# Altium footprint library mastermind.PCBLIB: 1061 footprints (part 31 of 67)
Each footprint in its own frame and in the unit in brackets; x right, y up, seen from the top. Pads: shape width x height; smd on the part's side, far side on the other; paste and mask are expansions set on the pad; w line width, h text height; cw(c..) or ccw(c..) is an arc to the next point about the centre after c.
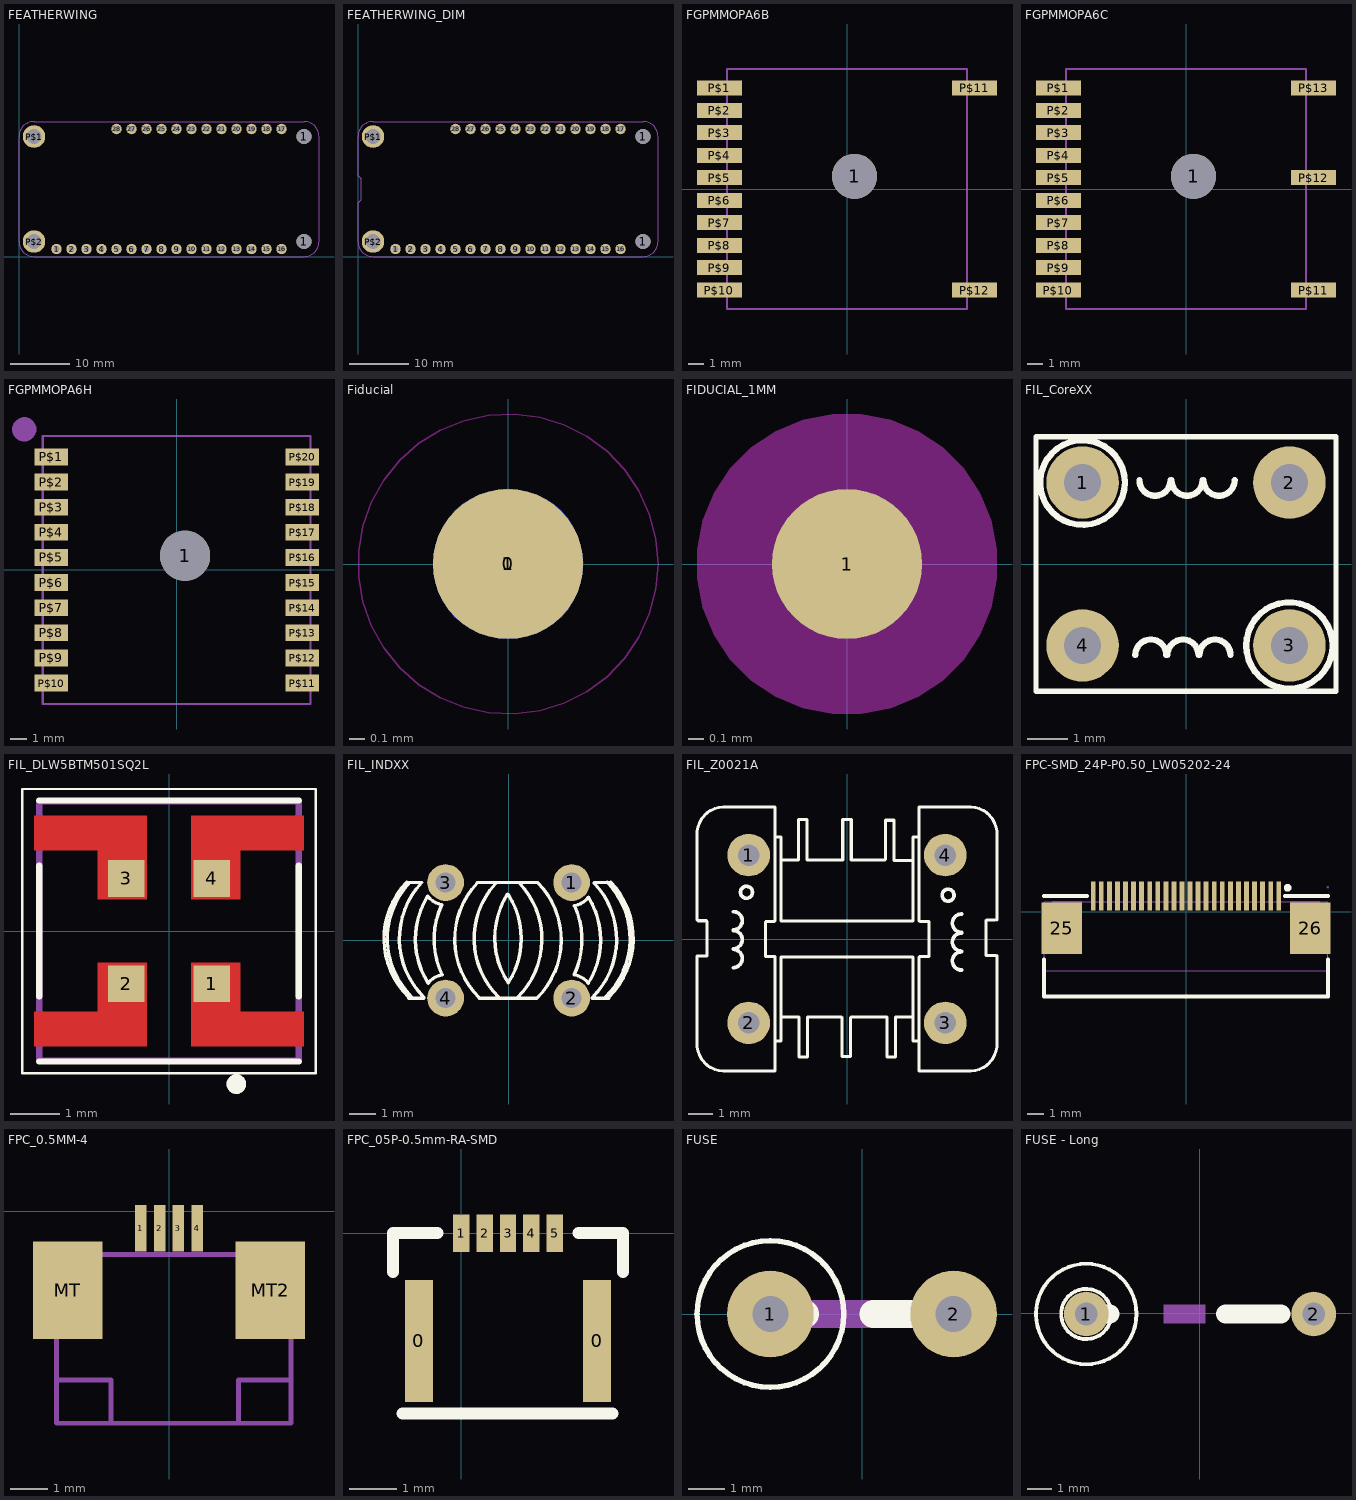
[diagram p30: the footprints below, top view; thin cyan lines are the x and y axes]

## FEATHERWING [mil]
pads (32):
  round 70 hole 39.37: 1(250,50) 2(350,50) 3(450,50) 4(550,50) 5(650,50) 6(750,50) 7(850,50) 8(950,50) 9(1050,50) 10(1150,50) 11(1250,50) 12(1350,50) 13(1450,50) 14(1550,50) 15(1650,50) 16(1750,50) 17(1750,850) 18(1650,850) 19(1550,850) 20(1450,850) 21(1350,850) 22(1250,850) 23(1150,850) 24(1050,850) 25(950,850) 26(850,850) 27(750,850) 28(650,850)
  round 100 hole 100: 1(1900,100) 1(1900,800)
  round 150 hole 98.43: P$1(100,800) P$2(100,100)
Mechanical 1:
  lines w0: 0,100 ccw(c100,100) 100,0 1900,0 ccw(c1900,100) 2000,100 2000,800 ccw(c1900,800) 1900,900 100,900 ccw(c100,800) 0,800 0,100

## FEATHERWING_DIM [mil]
pads (32):
  round 70 hole 39.37: 1(250,50) 2(350,50) 3(450,50) 4(550,50) 5(650,50) 6(750,50) 7(850,50) 8(950,50) 9(1050,50) 10(1150,50) 11(1250,50) 12(1350,50) 13(1450,50) 14(1550,50) 15(1650,50) 16(1750,50) 17(1750,850) 18(1650,850) 19(1550,850) 20(1450,850) 21(1350,850) 22(1250,850) 23(1150,850) 24(1050,850) 25(950,850) 26(850,850) 27(750,850) 28(650,850)
  round 100 hole 100: 1(1900,100) 1(1900,800)
  round 150 hole 98.43: P$1(100,800) P$2(100,100)
Mechanical 2:
  lines w0: 0,100 ccw(c100,100) 100,0 1900,0 ccw(c1900,100) 2000,100 2000,800 ccw(c1900,800) 1900,900 100,900 ccw(c100,800) 0,800 0,540 20,520 20,380 0,360 0,100

## FGPMMOPA6B [mm]
pads (13):
  round 3 hole 3: 1(0.5,0.85)
  rect 3x1 smd: P$1(-8.5,6.75) P$2(-8.5,5.25) P$3(-8.5,3.75) P$4(-8.5,2.25) P$5(-8.5,0.75) P$6(-8.5,-0.75) P$7(-8.5,-2.25) P$8(-8.5,-3.75) P$9(-8.5,-5.25) P$10(-8.5,-6.75) P$11(8.5,6.75) P$12(8.5,-6.75)
Mechanical 2:
  lines w0.127: -8,-8 8,-8 8,-7.5 ; -8,8 8,8 8,7.5 ; 8,-6 8,6
Mechanical 8:
  circle w0.813: c0.5,0.85 r0.5
  lines w0.127: -8,-8 8,-8 8,8 -8,8 -8,-8

## FGPMMOPA6C [mm]
pads (14):
  round 3 hole 3: 1(0.5,0.85)
  rect 3x1 smd: P$1(-8.5,6.75) P$2(-8.5,5.25) P$3(-8.5,3.75) P$4(-8.5,2.25) P$5(-8.5,0.75) P$6(-8.5,-0.75) P$7(-8.5,-2.25) P$8(-8.5,-3.75) P$9(-8.5,-5.25) P$10(-8.5,-6.75) P$11(8.5,-6.75) P$12(8.5,0.75) P$13(8.5,6.75)
Mechanical 2:
  lines w0.127: -8,-8 8,-8 8,-7.5 ; -8,8 8,8 8,7.5 ; 8,-6 8,6
Mechanical 8:
  circle w0.813: c0.5,0.85 r0.5
  lines w0.127: -8,-8 -8,8 8,8 8,-8 -8,-8

## FGPMMOPA6H [mm]
pads (21):
  round 3 hole 3: 1(0.5,0.85)
  rect 2x1 smd: P$1(-7.5,6.75) P$2(-7.5,5.25) P$3(-7.5,3.75) P$4(-7.5,2.25) P$5(-7.5,0.75) P$6(-7.5,-0.75) P$7(-7.5,-2.25) P$8(-7.5,-3.75) P$9(-7.5,-5.25) P$10(-7.5,-6.75) P$11(7.5,-6.75) P$12(7.5,-5.25) P$13(7.5,-3.75) P$14(7.5,-2.25) P$15(7.5,-0.75) P$16(7.5,0.75) P$17(7.5,2.25) P$18(7.5,3.75) P$19(7.5,5.25) P$20(7.5,6.75)
Mechanical 2:
  circle w0.813: c-9.1,8.4 r0.316
  lines w0.127: -8,-8 8,-8 8,-7.5 ; -8,8 8,8 8,7.5 ; 8,-6 8,6
Mechanical 8:
  circle w0.813: c0.5,0.85 r0.5
  lines w0.127: -8,-8 8,-8 8,8 -8,8 -8,-8

## Fiducial [mm]
pads (2):
  round 1 smd far side paste-10 mask+0.5: 0(0,0)
  round 1 smd paste-10 mask+0.5: 1(0,0)
Keep-Out Layer:
  circle w0.01: c0,0 r1

## FIDUCIAL_1MM [mm]
pads (1):
  rrect100% 1x1 smd paste-0.5 mask-0.5: 1(0,0)
Top Layer keep-out:
  region: -1,0 -1,-0.098 -0.962,-0.292 -0.886,-0.474 -0.777,-0.637 -0.637,-0.777 -0.474,-0.886 -0.292,-0.962 -0.098,-1 0,-1 0.098,-1 0.292,-0.962 0.474,-0.886 0.637,-0.777 0.777,-0.637 0.886,-0.474 0.962,-0.292 1,-0.098 1,0 1,0.098 0.962,0.292 0.886,0.474 0.777,0.637 0.637,0.777 0.474,0.886 0.292,0.962 0.098,1 0,1 -0.098,1 -0.292,0.962 -0.474,0.886 -0.637,0.777 -0.777,0.637 -0.886,0.474 -0.962,0.292 -1,0.098
Top Solder:
  region: -1,0 -1,-0.098 -0.962,-0.292 -0.886,-0.474 -0.777,-0.637 -0.637,-0.777 -0.474,-0.886 -0.292,-0.962 -0.098,-1 0,-1 0.098,-1 0.292,-0.962 0.474,-0.886 0.637,-0.777 0.777,-0.637 0.886,-0.474 0.962,-0.292 1,-0.098 1,0 1,0.098 0.962,0.292 0.886,0.474 0.777,0.637 0.637,0.777 0.474,0.886 0.292,0.962 0.098,1 0,1 -0.098,1 -0.292,0.962 -0.474,0.886 -0.637,0.777 -0.777,0.637 -0.886,0.474 -0.962,0.292 -1,0.098

## FIL_CoreXX [mil]
pads (4):
  round 70 hole 35.43: 1(-100,78.74) 2(100,78.74) 3(100,-78.74) 4(-100,-78.74)
Top Overlay:
  circle w6.06: c-100,78.74 r40.94
  circle w6.06: c100,-78.74 r41.72
  lines w5: -145,-123 145,-123 145,123 -145,123 -145,-123
  lines w6.06: -49,-88 cw(c-34,-88) -19,-88 ; -45,81 ccw(c-30,81) -15,81 ; -18,-88 cw(c-3,-88) 12,-88 ; -14,81 ccw(c1,81) 16,81 ; 13,-88 cw(c28,-88) 43,-88 ; 17,81 ccw(c32,81) 47,81

## FIL_DLW5BTM501SQ2L [mm]
pads (4):
  rect 0.75x0.75 smd: 1(0.875,-1.075) 2(-0.875,-1.075) 3(-0.875,1.075) 4(0.875,1.075)
Top Layer:
  region: -0.45,2.35 -2.75,2.35 -2.75,1.65 -1.45,1.65 -1.45,0.65 -0.45,0.65
  region: 1.45,1.65 2.75,1.65 2.75,2.35 0.45,2.35 0.45,0.65 1.45,0.65
  region: 2.75,-1.65 1.45,-1.65 1.45,-0.65 0.45,-0.65 0.45,-2.35 2.75,-2.35
  region: -0.45,-0.65 -1.45,-0.65 -1.45,-1.65 -2.75,-1.65 -2.75,-2.35 -0.45,-2.35
Top Overlay:
  circle w0.2: c1.375,-3.125 r0.1
  lines w0.05: -3,-2.9 -3,2.9 3,2.9 3,-2.9 -3,-2.9
  lines w0.127: -2.65,-2.663 2.65,-2.663 ; -2.65,-1.336 -2.65,1.336 ; -2.65,2.663 2.65,2.663 ; 2.65,-1.336 2.65,1.336
Top Paste:
  region: -0.45,-0.65 -1.45,-0.65 -1.45,-1.65 -2.75,-1.65 -2.75,-2.35 -0.45,-2.35
  region: 2.75,-1.65 1.45,-1.65 1.45,-0.65 0.45,-0.65 0.45,-2.35 2.75,-2.35
  region: 1.45,1.65 2.75,1.65 2.75,2.35 0.45,2.35 0.45,0.65 1.45,0.65
  region: -0.45,2.35 -2.75,2.35 -2.75,1.65 -1.45,1.65 -1.45,0.65 -0.45,0.65
Top Solder:
  region: -0.35,-0.55 -1.55,-0.55 -1.55,-1.55 -2.85,-1.55 -2.85,-2.45 -0.35,-2.45
  region: 2.85,-1.55 1.55,-1.55 1.55,-0.55 0.35,-0.55 0.35,-2.45 2.85,-2.45
  region: 1.55,1.55 2.85,1.55 2.85,2.45 0.35,2.45 0.35,0.55 1.55,0.55
  region: -0.35,2.45 -2.85,2.45 -2.85,1.55 -1.55,1.55 -1.55,0.55 -0.35,0.55
Mechanical 13:
  circle w0.2: c1.375,-3.125 r0.1
  lines w0.127: -2.65,-2.65 -2.65,2.65 2.65,2.65 2.65,-2.65 -2.65,-2.65
3D body "DLW5BTM501SQ2L--3DModel-STEP-1.STEP": height -1, standoff -3.5, extent -2.46,-2.5 2.54,2.5

## FIL_INDXX [mm]
pads (4):
  round 1.4 hole 0.762: 1(2.4,2.2) 2(2.4,-2.2) 3(-2.4,2.2) 4(-2.4,-2.2)
Top Overlay:
  lines w0.127: -3.886,2.2 -3.302,2.2 ; -3.886,2.209 ccw(c-1.638,0.064) -3.81,-2.159 ; -3.822,2.141 ccw(c-1.511,0.064) -3.683,-2.159 ; -3.81,-2.2 -3.226,-2.2 ; -3.306,2.204 ccw(c-1.054,0.064) -3.226,-2.159 ; -3.07,-1.627 cw(c-2.376,-2.192) -2.541,-1.313 ; -3.066,-1.631 cw(c-0.445,0.038) -3.082,1.682 ccw(c-2.378,2.233) -2.544,1.354 ; -2.548,1.356 ccw(c0.267,0.038) -2.533,-1.309 ; -1.193,2.184 ccw(c1.054,0.038) -1.118,-2.184 ; -1.193,2.2 1.111,2.2 ; -1.118,-2.2 1.067,-2.2 ; -0.516,2.146 ccw(c1.791,0.064) -0.381,-2.159 ; -0.042,1.76 ccw(c2.578,0.089) -0.013,-1.626 ; -0.019,-1.622 ccw(c-2.629,0.064) -0.014,1.743 ; 0.33,-2.184 ccw(c-1.841,0.038) 0.406,2.184 ; 1.067,-2.21 ccw(c-1.105,0.013) 1.111,2.191 ; 2.495,-1.308 ccw(c-0.317,0.013) 2.502,1.319 ; 2.5,-1.31 cw(c2.335,-2.189) 3.039,-1.637 ; 2.5,1.316 ccw(c2.335,2.195) 3.039,1.643 cw(c0.394,0.013) 3.03,-1.632 ; 3.175,-2.2 3.81,-2.2 ; 3.175,-2.184 ccw(c1.003,0.038) 3.251,2.184 ; 3.251,2.2 3.886,2.2 ; 3.683,-2.159 ccw(c1.511,0.064) 3.759,2.209 ; 3.81,-2.159 ccw(c1.638,0.064) 3.886,2.209

## FIL_Z0021A [mm]
pads (4):
  round 1.778 hole 0.9: 1(-4.1,3.5) 2(-4.1,-3.5) 3(4.1,-3.5) 4(4.1,3.5)
Top Overlay:
  circle w0.154: c4.216,1.829 r0.25
  circle w0.154: c-4.192,1.949 r0.25
  lines w0.127: -6.25,0.789 -6.25,4.5 cw(c-5.125,4.375) -5,5.5 -3,5.5 -3,0.75 ; -6.223,0.762 -5.867,0.762 -5.842,0.737 -5.842,-0.711 -6.25,-0.711 -6.25,-4.5 ccw(c-5.125,-4.375) -5,-5.5 -3,-5.5 -3,-0.75 ; -3.023,0.737 -3.378,0.737 -3.404,0.711 -3.404,-0.737 -2.996,-0.737 ; -3,-4.25 -2.75,-4.25 -2.75,-0.75 2.75,-0.75 2.75,-4.25 3,-4.25 ; -3,4.25 -2.75,4.25 -2.75,0.75 2.75,0.75 2.75,4.25 3,4.25 ; -2.743,-3.251 -2.007,-3.251 -2.007,-4.928 -1.651,-4.928 -1.651,-3.251 -0.229,-3.251 -0.203,-3.277 -0.203,-4.902 0.152,-4.902 0.152,-3.277 0.178,-3.251 1.676,-3.251 1.676,-4.928 2.032,-4.928 2.032,-3.251 2.718,-3.251 ; -2.667,3.302 -2.032,3.302 -2.032,4.978 -1.676,4.978 -1.676,3.302 -0.178,3.302 -0.178,4.978 0.178,4.978 0.178,3.302 1.575,3.302 1.6,3.327 1.6,4.953 1.956,4.953 1.956,3.277 2.692,3.277 ; 3,-0.75 3,-5.5 5,-5.5 ccw(c5.125,-4.375) 6.25,-4.5 6.25,-0.686 ; 3,0.75 3,5.5 5,5.5 cw(c5.125,4.375) 6.25,4.5 6.25,0.787 ; 3.021,-0.737 3.429,-0.737 3.429,0.711 3.404,0.737 3.048,0.737 ; 6.172,0.787 5.817,0.787 5.791,0.762 5.791,-0.686 6.199,-0.686
  lines w0.154: -4.75,-1.194 ccw(c-4.75,-0.813) -4.75,-0.432 ; -4.75,-0.406 ccw(c-4.75,-0.025) -4.75,0.356 ; -4.75,0.381 ccw(c-4.75,0.762) -4.75,1.143 ; 4.775,-1.295 cw(c4.775,-0.914) 4.775,-0.533 ; 4.775,-0.508 cw(c4.775,-0.127) 4.775,0.254 ; 4.775,0.279 cw(c4.775,0.66) 4.775,1.041

## FPC-SMD_24P-P0.50_LW05202-24 [mm]
pads (26):
  rect 0.3x1.8 smd paste+0 mask+0.051: 1(5.75,1) 2(5.25,1) 3(4.75,1) 4(4.25,1) 5(3.75,1) 6(3.25,1) 7(2.75,1) 8(2.25,1) 9(1.75,1) 10(1.25,1) 11(0.75,1) 12(0.25,1) 13(-0.25,1) 14(-0.75,1) 15(-1.25,1) 16(-1.75,1) 17(-2.25,1) 18(-2.75,1) 19(-3.25,1) 20(-3.75,1) 21(-4.25,1) 22(-4.75,1) 23(-5.25,1) 24(-5.75,1)
  rect 2.5x3.2 smd paste+0 mask+0.051: 25(-7.7,-1) 26(7.7,-1)
Top Overlay:
  circle w0.254: c6.3,1.5 r0.112
  lines w0.254: -8.8,-2.937 -8.8,-5.25 8.8,-5.25 8.8,-2.937 ; -8.8,1 -6.5,1 -6.131,1 ; 6.131,1 6.5,1 8.8,1
Mechanical 15:
  region: 8.86,1.543 8.859,1.567 8.824,1.6 8.776,1.6 8.741,1.567 8.74,1.543 8.741,1.519 8.776,1.486 8.824,1.486 8.859,1.519
  region: -5.65,0.643 -5.85,0.643 -5.85,1.543 -5.65,1.543
  region: -5.15,0.643 -5.35,0.643 -5.35,1.543 -5.15,1.543
  region: -4.65,0.643 -4.85,0.643 -4.85,1.543 -4.65,1.543
  region: -4.15,0.643 -4.35,0.643 -4.35,1.543 -4.15,1.543
  region: -3.65,0.643 -3.85,0.643 -3.85,1.543 -3.65,1.543
  region: -3.15,0.643 -3.35,0.643 -3.35,1.543 -3.15,1.543
  region: -2.65,0.643 -2.85,0.643 -2.85,1.543 -2.65,1.543
  region: -2.15,0.643 -2.35,0.643 -2.35,1.543 -2.15,1.543
  region: -1.65,0.643 -1.85,0.643 -1.85,1.543 -1.65,1.543
  region: -1.15,0.643 -1.35,0.643 -1.35,1.543 -1.15,1.543
  region: -0.65,0.643 -0.85,0.643 -0.85,1.543 -0.65,1.543
  region: -0.15,0.643 -0.35,0.643 -0.35,1.543 -0.15,1.543
  region: 0.35,0.643 0.15,0.643 0.15,1.543 0.35,1.543
  region: 0.85,0.643 0.65,0.643 0.65,1.543 0.85,1.543
  region: 1.35,0.643 1.15,0.643 1.15,1.543 1.35,1.543
  region: 1.85,0.643 1.65,0.643 1.65,1.543 1.85,1.543
  region: 2.35,0.643 2.15,0.643 2.15,1.543 2.35,1.543
  region: 2.85,0.643 2.65,0.643 2.65,1.543 2.85,1.543
  region: 3.35,0.643 3.15,0.643 3.15,1.543 3.35,1.543
  region: 3.85,0.643 3.65,0.643 3.65,1.543 3.85,1.543
  region: 4.35,0.643 4.15,0.643 4.15,1.543 4.35,1.543
  region: 4.85,0.643 4.65,0.643 4.65,1.543 4.85,1.543
  region: 5.35,0.643 5.15,0.643 5.15,1.543 5.35,1.543
  region: 5.85,0.643 5.65,0.643 5.65,1.543 5.85,1.543
  region: 8.3,-2.15 6.45,-2.15 6.45,0.65 8.3,0.65
  region: -6.45,-2.15 -8.3,-2.15 -8.3,0.65 -6.45,0.65
  lines w0.051: -8.8,-3.65 -8.8,0.65 8.8,0.65 8.8,-3.65 -8.8,-3.65

## FPC_0.5MM-4 [mm]
pads (6):
  rect 0.3x1.25 smd: 1(-0.75,-0.45) 2(-0.25,-0.45) 3(0.25,-0.45) 4(0.75,-0.45)
  rect 1.85x2.6 smd: MT(-2.7,-2.1) MT2(2.7,-2.1)
Mechanical 2:
  lines w0.127: -1.55,-5.6 -1.55,-4.5 -3,-4.5 ; 1.85,-5.6 1.85,-4.5 3.2,-4.5 ; -3,-4.5 -3,-5.65 3.25,-5.65 3.25,-1.65 2.75,-1.15 -2.45,-1.15 -3,-1.7 -3,-4.5

## FPC_05P-0.5mm-RA-SMD [mm]
pads (7):
  rect 0.6x2.6 smd: 0(-0.9,-2.3) 0(2.9,-2.3)
  rect 0.35x0.8 smd: 1(0,0) 2(0.5,0) 3(1,0) 4(1.5,0) 5(2,0)
Top Overlay:
  lines w0.254: -1.45,-0.825 -1.45,0 -0.5,0 ; -1.25,-3.85 3.225,-3.85 ; 2.5,0 3.45,0 3.45,-0.825
3D body: height 2.05, standoff 0, extent -1.45,-3.85 3.45,0

## FUSE [mm]
pads (2):
  round 2.4 hole 1: 1(-2.54,0) 2(2.54,0)
Top Overlay:
  circle w0.152: c-2.54,0 r2.032
  circle w0.152: c-2.54,0 r1.016
  lines w0.762: -2.54,0 -1.575,0 ; 0.305,0 2.54,0
Mechanical 2:
  region: -1.473,-0.381 -1.473,0.381 0.203,0.381 0.203,-0.381
3D body "Fuse1.STEP": height 11.69, standoff -3, extent -4.44,-1.9 2.895,1.9

## FUSE - Long [mm]
pads (2):
  round 1.8 hole 0.914: 1(-4.591,-0.023) 2(4.609,-0.023)
Top Overlay:
  circle w0.152: c-4.591,-0.023 r1.016
  circle w0.152: c-4.591,-0.023 r2.032
  lines w0.762: -4.591,-0.023 -3.625,-0.023 ; 1.044,-0.023 3.279,-0.023
Mechanical 2:
  region: -1.464,-0.404 -1.464,0.358 0.213,0.358 0.213,-0.404
3D body "Fuse1.STEP": height 11.69, standoff -3, extent -5.031,-1.903 2.304,1.897